# Altium footprint library main.PcbLib: 217 footprints (part 10 of 14)
Each footprint in its own frame and in the unit in brackets; x right, y up, seen from the top. Pads: shape width x height; smd on the part's side, far side on the other; paste and mask are expansions set on the pad; w line width, h text height; cw(c..) or ccw(c..) is an arc to the next point about the centre after c.
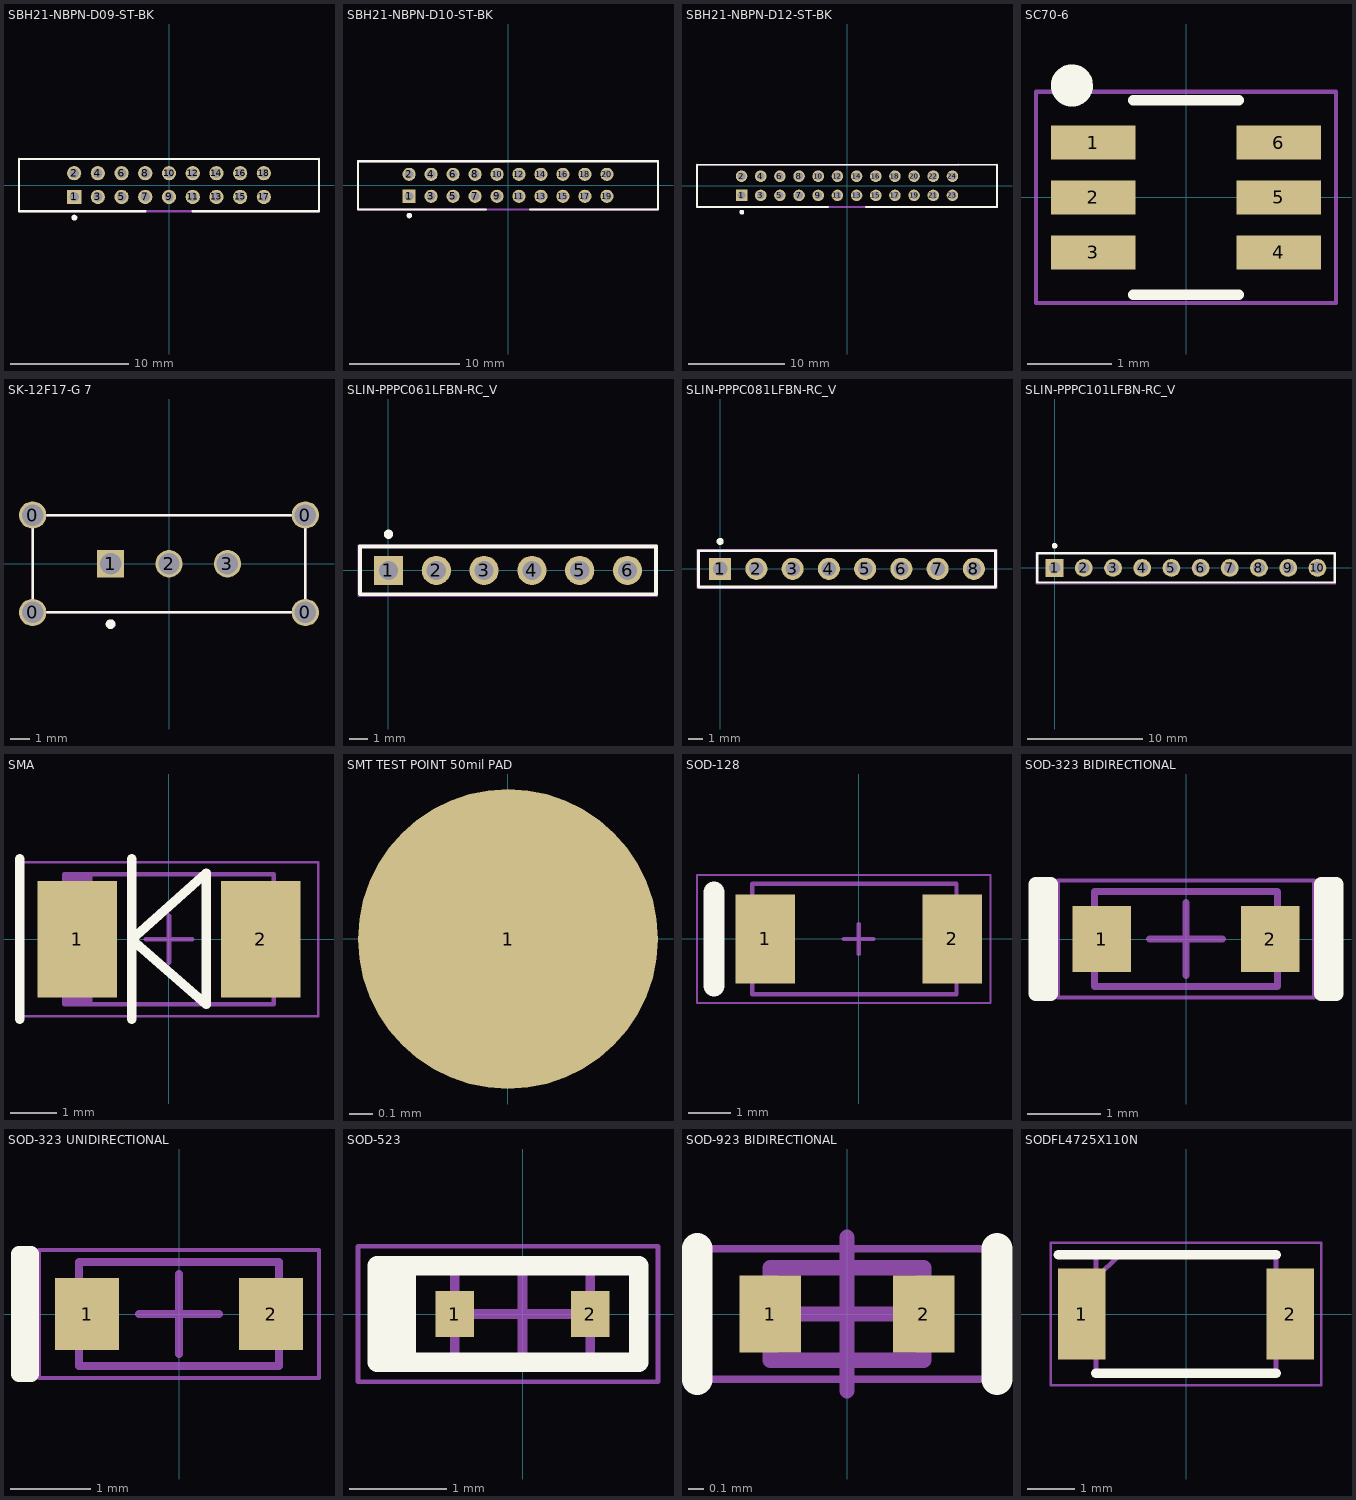
[diagram p9: the footprints below, top view; thin cyan lines are the x and y axes]

## SBH21-NBPN-D09-ST-BK [mm] "SBH21-NBPN-D09-ST-BK"
height 5.4
pads (18):
  rect 1.2x1.2 hole 0.8 paste-1000 mask+0: 1(-8,-1)
  round 1.2 hole 0.8 paste-1000 mask+0: 2(-8,1) 3(-6,-1) 4(-6,1) 5(-4,-1) 6(-4,1) 7(-2,-1) 8(-2,1) 9(0,-1) 10(0,1) 11(2,-1) 12(2,1) 13(4,-1) 14(4,1) 15(6,-1) 16(6,1) 17(8,-1) 18(8,1)
Top Overlay:
  circle w0.25: c-7.98,-2.75 r0.125
  lines w0.2: -12.65,-2.2 -12.65,2.2 12.65,2.2 12.65,-2.2 2,-2.2 ; -12.645,-2.2 -2,-2.2
Mechanical 7:
  text ".Designator" at -9.94,-1.63 h1.52
Mechanical 13:
  lines w0.2: 0.655,2.2 -12.65,2.2 -12.65,-2.2 12.65,-2.2 12.65,2.2
Mechanical 15:
  lines w0.2: -12.65,2.2 12.65,2.207 12.65,-2.2 -12.65,-2.2 -12.65,2.205
3D body: height 5.6, standoff 0, extent -12.65,-2.2 12.65,2.2

## SBH21-NBPN-D10-ST-BK [mm] "SBH21-NBPN-D10-ST-BK"
height 5.4
pads (20):
  rect 1.2x1.2 hole 0.8 paste-1000 mask+0: 1(-9,-1)
  round 1.2 hole 0.8 paste-1000 mask+0: 2(-9,1) 3(-7,-1) 4(-7,1) 5(-5,-1) 6(-5,1) 7(-3,-1) 8(-3,1) 9(-1,-1) 10(-1,1) 11(1,-1) 12(1,1) 13(3,-1) 14(3,1) 15(5,-1) 16(5,1) 17(7,-1) 18(7,1) 19(9,-1) 20(9,1)
Top Overlay:
  circle w0.25: c-8.98,-2.75 r0.125
  lines w0.2: -13.65,-2.2 -13.65,2.2 13.65,2.2 13.65,-2.2 2,-2.2 ; -13.645,-2.2 -2,-2.2
Mechanical 7:
  text ".Designator" at -10.94,-1.63 h1.52
Mechanical 13:
  lines w0.2: -0.345,2.2 -13.65,2.2 -13.65,-2.2 13.65,-2.2 13.65,2.2
Mechanical 15:
  lines w0.2: -13.65,2.2 13.65,2.208 13.65,-2.2 -13.65,-2.2 -13.65,2.205
3D body: height 5.6, standoff 0, extent -13.65,-2.2 13.65,2.2

## SBH21-NBPN-D12-ST-BK [mm] "SBH21-NBPN-D12-ST-BK"
height 5.4
pads (24):
  rect 1.2x1.2 hole 0.8 paste-1000 mask+0: 1(-11,-1)
  round 1.2 hole 0.8 paste-1000 mask+0: 2(-11,1) 3(-9,-1) 4(-9,1) 5(-7,-1) 6(-7,1) 7(-5,-1) 8(-5,1) 9(-3,-1) 10(-3,1) 11(-1,-1) 12(-1,1) 13(1,-1) 14(1,1) 15(3,-1) 16(3,1) 17(5,-1) 18(5,1) 19(7,-1) 20(7,1) 21(9,-1) 22(9,1) 23(11,-1) 24(11,1)
Top Overlay:
  circle w0.25: c-10.98,-2.75 r0.125
  lines w0.2: -15.65,-2.2 -15.65,2.2 15.65,2.2 15.65,-2.2 2,-2.2 ; -15.645,-2.2 -2,-2.2
Mechanical 7:
  text ".Designator" at -12.94,-1.63 h1.52
Mechanical 13:
  lines w0.2: -2.345,2.2 -15.65,2.2 -15.65,-2.2 11.65,-2.2 ; 15.65,-2.2 15.65,2.2
Mechanical 15:
  lines w0.2: -15.65,2.2 11.65,2.208 ; -15.65,2.205 -15.65,-2.2 11.65,-2.2 ; 15.65,-2.2 15.65,2.208
3D body: height 5.6, standoff 0, extent -15.65,-2.2 15.65,2.2

## SC70-6 [mm]
pads (6):
  rect 1x0.4 smd: 1(-1.1,0.65) 2(-1.1,0) 3(-1.1,-0.65) 4(1.1,-0.65) 5(1.1,0) 6(1.1,0.65)
Top Overlay:
  lines w0.127: -0.625,-1.15 0.625,-1.15 ; -0.625,1.15 0.625,1.15
  lines w0.25: -1.234,1.371 ccw(c-1.35,1.325) -1.225,1.325
Mechanical 7:
  text ".Designator" at -1.016,-0.381 h0.76
Mechanical 15:
  lines w0.05: -1.775,-1.25 1.775,-1.25 1.775,1.25 -1.775,1.25 -1.775,-1.25
3D body "User Library-SOT363-2.STEP": height 1.1, standoff 0, extent -1.2,-1.1 1.2,1.1

## SK-12F17-G 7 [mm] "SK-12F17-G 7"
height 8
pads (7):
  round 1.4 hole 1.1: 0(-7,-2.5) 0(-7,2.5) 0(7,-2.5) 0(7,2.5) 2(0,0) 3(3,0)
  rect 1.4x1.4 hole 1.1: 1(-3,0)
Top Overlay:
  circle w0.25: c-3,-3.1 r0.125
  lines w0.127: -7,-2.5 7,-2.5 7,2.5 -7,2.5 -7,-2.5
Mechanical 7:
  text ".Designator" at -4.3,-0.572 h1.52
Mechanical 13:
  lines w0.127: -7,-2.5 -7,2.5 7,2.5 7,-2.5 -7,-2.5
Mechanical 15:
  lines w0.05: -7,-2.5 -7,2.5 7,2.5 7,-2.5 -7,-2.5
3D body: height 8, standoff 0, extent -7,-2.5 7,2.5

## SLIN-PPPC061LFBN-RC_V [mm] "THD, 6-Leads"
height 8.5
pads (6):
  rect 1.55x1.55 hole 1.02: 1(0,0)
  round 1.55 hole 1.02: 2(2.54,0) 3(5.08,0) 4(7.62,0) 5(10.16,0) 6(12.7,0)
Top Overlay:
  circle w0.25: c0,1.92 r0.125
  lines w0.2: -1.52,-1.27 14.22,-1.27 14.22,1.27 -1.52,1.27 -1.52,-1.27
Mechanical 7:
  text ".Designator" at 1.006,-0.677 h1.52
Mechanical 15:
  lines w0.05: -1.62,-1.37 14.32,-1.37 14.32,1.37 -1.62,1.37 -1.62,-1.37
3D body "User Library-zl262-6s_p2-54_l15-74_w2-54_h8-5.STEP": height 8.5, standoff -3, extent -1.52,-1.27 14.22,1.27

## SLIN-PPPC081LFBN-RC_V [mm] "THD, 8-Leads, Body 20.82x2.54mm, Pitch 2.54mm"
height 8.5
pads (8):
  rect 1.55x1.55 hole 1.02: 1(0,0)
  round 1.55 hole 1.02: 2(2.54,0) 3(5.08,0) 4(7.62,0) 5(10.16,0) 6(12.7,0) 7(15.24,0) 8(17.78,0)
Top Overlay:
  circle w0.25: c0,1.92 r0.125
  lines w0.2: -1.52,-1.27 19.3,-1.27 19.3,1.27 -1.52,1.27 -1.52,-1.27
Mechanical 7:
  text ".Designator" at 1.006,-0.677 h1.52
Mechanical 15:
  lines w0.05: -1.62,-1.37 19.4,-1.37 19.4,1.37 -1.62,1.37 -1.62,-1.37
3D body "_ _ _C081LFBN-RC.STEP": height 8.5, standoff -3.2, extent -1.52,-1.27 19.3,1.27

## SLIN-PPPC101LFBN-RC_V [mm] "THD, 10-Leads"
height 8.5
pads (10):
  rect 1.55x1.55 hole 1.02: 1(0,0)
  round 1.55 hole 1.02: 2(2.54,0) 3(5.08,0) 4(7.62,0) 5(10.16,0) 6(12.7,0) 7(15.24,0) 8(17.78,0) 9(20.32,0) 10(22.86,0)
Top Overlay:
  circle w0.25: c0,1.92 r0.125
  lines w0.2: -1.52,-1.27 24.38,-1.27 24.38,1.27 -1.52,1.27 -1.52,-1.27
Mechanical 7:
  text ".Designator" at 1.052,-0.686 h1.52
Mechanical 15:
  lines w0.05: -1.62,-1.37 24.48,-1.37 24.48,1.37 -1.62,1.37 -1.62,-1.37
3D body "User Library-zl262-10s_p2-54_l25-9_w2-54_h8-5.STEP": height 8.5, standoff -3, extent -1.52,-1.27 24.38,1.27

## SMA [mm] "SMA"
height 2.29
pads (2):
  rect 1.7x2.5 smd: 1(-1.967,0) 2(1.967,0)
Top Overlay:
  lines w0.2: -3.2,-1.714 -3.2,1.728 ; -0.8,-1.714 -0.8,1.728 ; -0.8,0 0.8,1.422 0.8,-1.397 -0.8,0
Mechanical 7:
  text ".Designator" at -1.651,-0.508 h1.52
Mechanical 13:
  rectangle: -2.25,-1.395 -1.645,1.395
  lines w0.1: -2.25,-1.395 2.25,-1.395 2.25,1.395 -2.25,1.395 -2.25,-1.395
Mechanical 15:
  lines w0.05: -3.2,-1.65 3.2,-1.65 3.2,1.65 -3.2,1.65 -3.2,-1.65
  lines w0.1: -0.5,0 0.5,0 ; 0,-0.5 0,0.5
3D body "DIOM4227X23N.step": height 2.29, standoff 0, extent -2.47,-1.395 2.47,1.395

## SMT TEST POINT 50mil PAD [mm] "SMT TEST POINT 50mil PAD"
height 1.8
pads (1):
  round 1.27 smd paste-2: 1(0,0)
Mechanical 7:
  text ".Designator" at -0.563,-0.327 h0.76

## SOD-128 [mm] "SOD-128"
height 0.4
pads (2):
  rect 1.4x2.1 smd: 1(-2.2,0) 2(2.2,0)
Top Overlay:
  lines w0.5: -3.4,-1.1 -3.4,1.1
Mechanical 7:
  text ".Designator" at -1,-0.4 h0.76
Mechanical 13:
  lines w0.1: -2.5,-1.3 2.3,-1.3 2.3,1.3 -2.5,1.3 -2.5,-1.3
Mechanical 15:
  lines w0.05: -3.8,-1.5 3.1,-1.5 3.1,1.5 -3.8,1.5 -3.8,-1.5
  lines w0.1: -0.35,0 0.35,0 ; 0,-0.35 0,0.35
3D body "SOD128.step": height 1.08, standoff 0.01, extent -2.45,-1.3 2.25,1.3

## SOD-323 BIDIRECTIONAL [mm] "SOD-323 BIDIRECTIONAL"
height 0.65
pads (2):
  rect 0.8x0.9 smd: 1(-1.15,0) 2(1.15,0)
Top Overlay:
  lines w0.2: -2.05,-0.75 -1.85,-0.75 ; -2.05,-0.732 -2.05,0.75 -1.85,0.75 -1.85,-0.732 ; 1.85,-0.75 2.05,-0.75 2.05,0.75 1.85,0.75 1.85,-0.75
Mechanical 7:
  text ".Designator" at -1.325,-0.454 h0.76
Mechanical 13:
  lines w0.1: -1.25,-0.65 1.25,-0.65 1.25,0.65 -1.25,0.65 -1.25,-0.65
Mechanical 15:
  lines w0.05: -1.75,-0.8 1.75,-0.8 1.75,0.8 -1.75,0.8 -1.75,-0.8
  lines w0.1: -0.5,0 0.5,0 ; 0,-0.5 0,0.5
3D body "User Library-SOD323.STEP": height 0.9, standoff -0.09, extent -1.25,-0.625 1.25,0.625

## SOD-323 UNIDIRECTIONAL [mm] "SOD-323 UNIDIRECTIONAL"
height 0.65
pads (2):
  rect 0.8x0.9 smd: 1(-1.15,0) 2(1.15,0)
Top Overlay:
  lines w0.2: -2,-0.75 -1.85,-0.75 -1.85,0.75 -2,0.75 -2,-0.75
Mechanical 7:
  text ".Designator" at -1.325,-0.454 h0.76
Mechanical 13:
  lines w0.1: -1.25,-0.65 1.25,-0.65 1.25,0.65 -1.25,0.65 -1.25,-0.65
Mechanical 15:
  lines w0.05: -1.75,-0.8 1.75,-0.8 1.75,0.8 -1.75,0.8 -1.75,-0.8
  lines w0.1: -0.5,0 0.5,0 ; 0,-0.5 0,0.5
3D body "User Library-SOD323.STEP": height 0.9, standoff -0.09, extent -1.25,-0.625 1.25,0.625

## SOD-523 [mm] "SOD-523"
height 1.35
pads (2):
  rect 0.4x0.48 smd: 1(-0.7,0) 2(0.7,0)
Top Overlay:
  lines w0.2: -1.4,-0.5 -1.4,0.5 -1.3,0.4 -1.3,-0.5 -1.2,-0.5 ; -1.2,0.5 -1.2,-0.5 ; -1.1,-0.5 -1.5,-0.5 -1.5,0.5 1.2,0.5 1.2,-0.5 -1.2,-0.5
Mechanical 7:
  text ".Designator" at -1,-0.4 h0.76
Mechanical 13:
  lines w0.1: -0.7,-0.5 -0.7,0.5 0.7,0.5 0.7,-0.5 -0.7,-0.5
Mechanical 15:
  lines w0.05: -1.7,-0.7 -1.7,0.7 1.4,0.7 1.4,-0.7 -1.7,-0.7
  lines w0.1: -0.5,0 0.5,0 -0.5,0 ; 0,-0.5 0,0.5 0,-0.5
3D body "User Library-SOD-523F.step": height 0.7, standoff 0, extent -0.8,-0.399 0.8,0.399

## SOD-923 BIDIRECTIONAL [mm] "SOD-923 BIDIRECTIONAL"
height 0.65
pads (2):
  rect 0.4x0.5 smd: 1(-0.5,0) 2(0.5,0)
Top Overlay:
  lines w0.2: -0.975,-0.425 -0.975,0.425 -0.975,-0.425 ; 0.975,-0.425 0.975,0.425 0.975,-0.425
Mechanical 7:
  text ".Designator" at -1.325,-0.454 h0.76
Mechanical 13:
  lines w0.1: -0.5,-0.3 -0.5,0.3 0.5,0.3 0.5,-0.3 -0.5,-0.3
Mechanical 15:
  lines w0.05: -0.975,-0.425 -0.975,0.425 0.975,0.425 0.975,-0.425 -0.975,-0.425
  lines w0.1: -0.5,0 0.5,0 ; 0,-0.5 0,0.5
3D body "SOD-923.STEP": height 0.4, standoff 0, extent -0.5,-0.3 0.5,0.3

## SODFL4725X110N [mm]
pads (2):
  rect 1x1.93 smd: 1(-2.2,0) 2(2.2,0)
Top Overlay:
  lines w0.2: -2.7,1.25 1.9,1.25 ; -1.9,-1.25 1.9,-1.25
Mechanical 13:
  lines w0.1: -1.9,0.75 -1.4,1.25 ; -1.9,-1.25 -1.9,1.25 1.9,1.25 1.9,-1.25 -1.9,-1.25
Mechanical 15:
  lines w0.05: -2.85,-1.5 -2.85,1.5 2.85,1.5 2.85,-1.5 -2.85,-1.5
3D body "PMEG60T50ELPX.stp": height 1.1, standoff 0, extent -2.35,-1.25 2.35,1.25